# Altium footprint library mw.PcbLib: 113 footprints (part 5 of 8)
Each footprint in its own frame and in the unit in brackets; x right, y up, seen from the top. Pads: shape width x height; smd on the part's side, far side on the other; paste and mask are expansions set on the pad; w line width, h text height; cw(c..) or ccw(c..) is an arc to the next point about the centre after c.
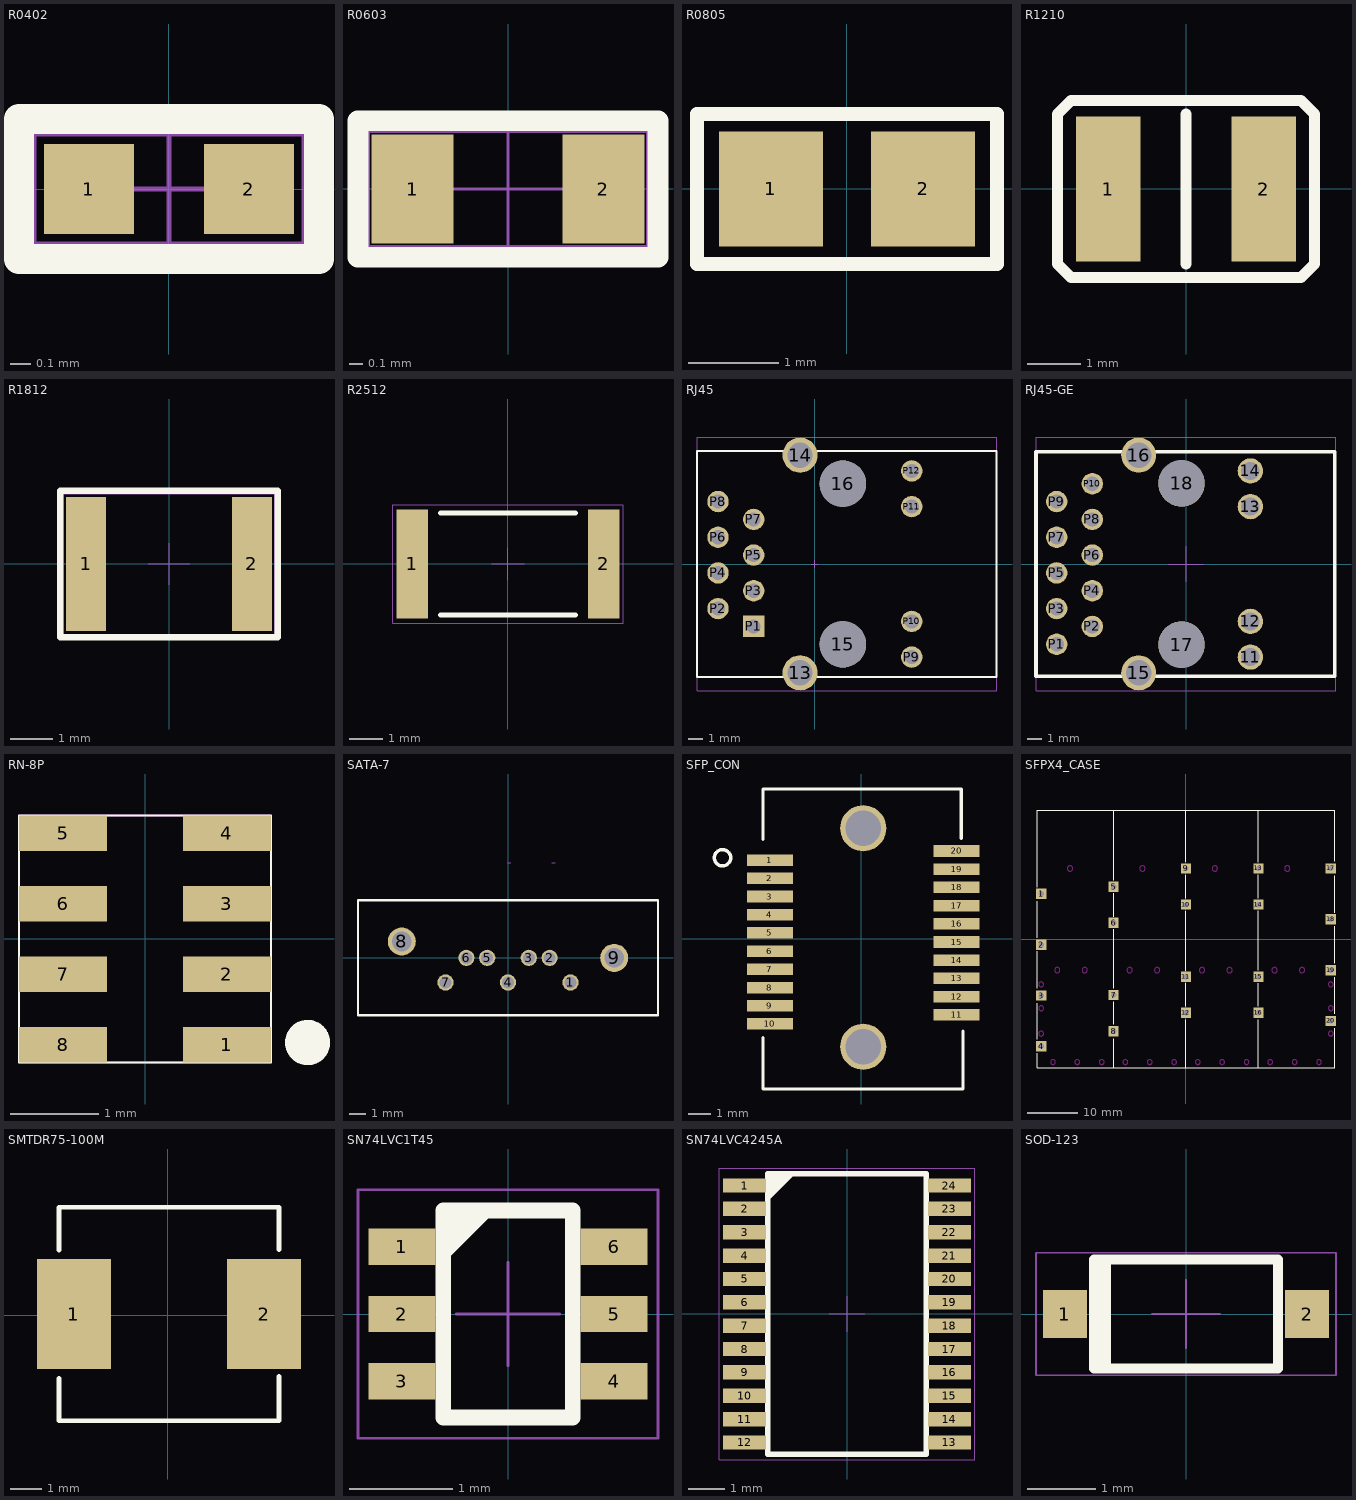
[diagram p4: the footprints below, top view; thin cyan lines are the x and y axes]

## R0402 [mm] "R0402"
pads (2):
  rect 0.45x0.45 smd: 1(-0.4,0) 2(0.4,0)
Top Overlay:
  lines w0.152: -0.75,-0.35 0.75,-0.35 0.75,0.35 -0.75,0.35 -0.75,-0.35
Mechanical 15:
  lines w0.025: -0.275,0 0.275,0 ; 0,-0.275 0,0.275 ; -0.674,-0.274 0.674,-0.274 0.674,0.274 -0.674,0.274 -0.674,-0.274
3D body "0402.STEP": height 0.3, standoff 0, extent -0.505,-0.247 0.495,0.254

## R0603 [mm] "R0603"
pads (2):
  rect 0.6x0.8 smd: 1(-0.7,-0.001) 2(0.7,-0.001)
Top Overlay:
  lines w0.152: -1.1,-0.501 -1.1,0.499 1.1,0.499 1.1,-0.501 -1.1,-0.501
Mechanical 15:
  lines w0.025: -0.45,-0.001 0.45,-0.001 ; 0,-0.451 0,0.449 ; -1.024,-0.425 1.024,-0.425 1.024,0.423 -1.024,0.423 -1.024,-0.425
3D body "0603.STEP": height 0.4, standoff 0, extent -0.801,-0.4 0.799,0.4

## R0805 [mil]
pads (2):
  rect 45x50 smd: 1(-33,0) 2(33,0)
Top Overlay:
  lines w6: -65,-32.5 65,-32.5 65,32.5 -65,32.5 -65,-32.5

## R1210 [mm] "R1210"
pads (2):
  rect 1.2x2.7 smd: 1(-1.45,-0.007) 2(1.45,-0.007)
Top Overlay:
  lines w0.203: 0,-1.404 0,1.39 ; -2.4,-1.404 -2.146,-1.658 2.146,-1.658 2.4,-1.404 2.4,1.39 2.146,1.644 -2.146,1.644 -2.4,1.39 -2.4,-1.404

## R1812 [mm]
height 0.6
pads (2):
  rect 0.95x3.2 smd: 1(-1.975,0) 2(1.975,0)
Top Overlay:
  lines w0.152: -2.591,-1.75 2.591,-1.75 2.591,1.75 -2.591,1.75 -2.591,-1.75
Mechanical 15:
  lines w0.025: -0.5,0 0.5,0 ; 0,-0.5 0,0.5 ; -2.515,-1.676 2.515,-1.676 2.515,1.676 -2.515,1.676 -2.515,-1.676
3D body "1812.STEP": height 0.6, standoff 0, extent -2.25,-1.6 2.25,1.6

## R2512 [mm] "Chip Resistor, 2-Leads, Body 6.35x3.20mm, IPC High Density"
height 0.55
pads (2):
  rect 0.95x3.3 smd: 1(-2.9,0) 2(2.9,0)
Top Overlay:
  lines w0.152: -2.05,-1.55 2.05,-1.55 ; -2.05,1.55 2.05,1.55
Mechanical 15:
  lines w0.025: -0.5,0 0.5,0 ; 0,-0.5 0,0.5 ; -3.5,-1.8 -3.5,1.8 3.5,1.8 3.5,-1.8 -3.5,-1.8
3D body: height 0.55, standoff 0, extent -2.725,-1.7 2.725,1.7
3D body: height 0.55, standoff 0, extent -3.225,-1.7 -2.725,1.7
3D body: height 0.55, standoff 0, extent 2.725,-1.7 3.225,1.7

## RJ45 [mm]
pads (16):
  round 2.5 hole 1.8: 13(-1.055,-7.745) 14(-1.055,7.745)
  round 3.3 hole 3.3 unplated: 15(1.995,-5.715) 16(1.995,5.715)
  rect 1.524x1.524 hole 1: P1(-4.355,-4.445)
  round 1.524 hole 1: P2(-6.895,-3.175) P3(-4.355,-1.905) P4(-6.895,-0.635) P5(-4.355,0.635) P6(-6.895,1.905) P7(-4.355,3.175) P8(-6.895,4.445) P9(6.895,-6.625) P10(6.895,-4.085) P11(6.895,4.085) P12(6.895,6.625)
Top Overlay:
  lines w0.152: -8.385,-8.05 -8.385,8.05 12.915,8.05 12.915,-8.05 -8.385,-8.05
Mechanical 15:
  lines w0.025: -0.254,0 0.254,0 ; 0,-0.254 0,0.254 ; -8.391,-9.035 -8.391,9.035 12.963,9.035 12.963,-9.035 -8.391,-9.035

## RJ45-GE [mil]
pads (18):
  round 70.87 hole 51.18: 11(180.41,-260.82) 12(180.41,-160.82) 13(180.41,160.83) 14(180.41,260.83)
  round 98 hole 70.87: 15(-132.58,-305.11) 16(-132.58,305.12)
  round 129.92 hole 129.92: 17(-12.5,-225.98) 18(-12.5,225.99)
  round 60 hole 40: P1(-362.5,-225) P2(-262.5,-175) P3(-362.5,-125) P4(-262.5,-75) P5(-362.5,-25) P6(-262.5,25) P7(-362.5,75) P8(-262.5,125) P9(-362.5,175) P10(-262.5,225)
Top Overlay:
  lines w10: -420.4,-314 -420.4,314 417.1,314 417.1,-314 -420.4,-314
Mechanical 15:
  lines w1: -50,0 50,0 ; 0,-50 0,50 ; -420.37,-355.69 420.37,-355.69 420.37,355.69 -420.37,355.69 -420.37,-355.69
3D body "hr911130a.STEP": height 506.61, standoff -123.31, extent -420.26,-317.1 418.32,318.33

## RN-8P [mm] "RN-8P"
pads (8):
  rect 1x0.4 smd: 1(0.929,-1.2) 2(0.929,-0.4) 3(0.929,0.4) 4(0.929,1.2) 5(-0.929,1.2) 6(-0.929,0.4) 7(-0.929,-0.4) 8(-0.929,-1.2)
Top Overlay:
  circle w0.254: c1.844,-1.175 r0.13
  lines w0.025: -1.429,-1.4 1.429,-1.4 1.429,1.4 -1.429,1.4 -1.429,-1.4
Mechanical 14:
  lines w0.025: -1.429,-1.4 1.429,-1.4 1.429,1.4 -1.429,1.4 -1.429,-1.4

## SATA-7 [mm] "SATA-7"
pads (9):
  round 0.994 hole 0.74: 1(3.81,-1.5) 2(2.54,0) 3(1.27,0) 4(0,-1.5) 5(-1.27,0) 6(-2.54,0) 7(-3.81,-1.5)
  round 1.708 hole 1.2: 8(-6.48,1) 9(6.48,0)
Top Overlay:
  lines w0.152: -9.15,-3.5 -9.15,3.5 9.15,3.5 9.15,-3.5 -9.15,-3.5
Mechanical 11:
  lines w0.025: -0.025,5.802 0.178,5.802 ; 2.667,5.802 2.87,5.802

## SFP_CON [mil] "SFP_CON"
pads (22):
  rect 80x20 smd: 1(-158,136) 2(-158,104.5) 3(-158,73.01) 4(-158,41.51) 5(-158,10.02) 6(-158,-21.48) 7(-158,-52.98) 8(-158,-84.47) 9(-158,-115.97) 10(-158,-147.46) 11(164.83,-131.72) 12(164.83,-100.22) 13(164.83,-68.72) 14(164.83,-37.23) 15(164.83,-5.73) 16(164.83,25.76) 17(164.83,57.26) 18(164.83,88.76) 19(164.83,120.25) 20(164.83,151.75)
  round 80 hole 62: " "(3.42,-186.83) " "(3.42,191.12)
Top Overlay:
  circle w6: c-240,140 r14.14
  lines w6: -170,-171 -170,-260 176,-260 176,-160 ; -170,172 -170,259 173,259 173,174

## SFPX4_CASE [mil] "SFPX4_CASE"
pads (20):
  rect 80x80 hole 42: 1(-1122.04,349.41) 2(-1122.04,-44.29) 3(-1122.04,-437.99) 4(-1122.04,-831.69) 5(-561.02,404.53) 6(-561.02,125) 7(-561.02,-434.05) 8(-561.02,-713.58) 9(0,546.26) 10(0,266.74) 11(0,-292.32) 12(0,-571.85) 13(561.02,546.26) 14(561.02,266.74) 15(561.02,-292.32) 16(561.02,-571.85) 17(1122.04,546.26) 18(1122.04,152.56) 19(1122.04,-241.14) 20(1122.04,-634.84)
Top Overlay:
  lines w6: -1153.54,-885.98 -1153.54,-999.01 1153.54,-999.01 1153.54,-690.98 ; -1153.54,-775.98 -1153.54,-495.98 ; -1153.54,-380.98 -1153.54,-95.98 ; -1153.54,9.02 -1153.54,294.02 ; -1153.54,399.02 -1153.54,999.02 1153.54,999.02 1153.54,604.02 ; -561.02,-995.98 -561.02,-770.98 ; -561.02,-660.98 -561.02,-485.98 ; -561.02,-380.98 -561.02,74.02 ; -561.02,174.02 -561.02,354.02 ; -561.02,454.02 -561.02,998 -560,999.02 ; 0,-995.98 0,-625.98 ; 0,-520.98 0,-340.98 ; 0,-245.98 0,214.02 ; 0,314.02 0,494.02 ; 0,599.02 0,998 1.02,999.02 ; 561.02,-995.98 561.02,-625.98 ; 561.02,-520.98 561.02,-340.98 ; 561.02,-240.98 561.02,219.02 ; 561.02,314.02 561.02,499.02 ; 561.02,594.02 561.02,998 562.04,999.02 ; 1153.54,-580.98 1153.54,-295.98 ; 1153.54,-185.98 1153.54,99.02 ; 1153.54,204.02 1153.54,489.02
Keep-Out Layer:
  circle w1: c-337.79,546.26 r21
  circle w1: c-223.62,-241.14 r21
  circle w1: c-436.22,-241.14 r21
  circle w1: c223.23,546.26 r21
  circle w1: c337.4,-241.14 r21
  circle w1: c124.8,-241.14 r21
  circle w1: c-280.71,-953.74 r19
  circle w1: c-469.68,-953.74 r19
  circle w1: c-91.73,-953.74 r19
  circle w1: c280.31,-953.74 r19
  circle w1: c91.34,-953.74 r19
  circle w1: c469.29,-953.74 r19
  circle w1: c-997.24,-241.14 r21
  circle w1: c-784.64,-241.14 r21
  circle w1: c-1122.04,-351.38 r19
  circle w1: c-1122.04,-536.42 r19
  circle w1: c-1122.04,-733.27 r19
  circle w1: c-841.73,-953.74 r19
  circle w1: c-1030.7,-953.74 r19
  circle w1: c-652.75,-953.74 r19
  circle w1: c-898.81,546.26 r21
  circle w1: c784.25,546.26 r21
  circle w1: c685.82,-241.14 r21
  circle w1: c898.42,-241.14 r21
  circle w1: c1122.04,-351.38 r19
  circle w1: c1122.04,-536.42 r19
  circle w1: c1122.04,-733.27 r19
  circle w1: c652.36,-953.74 r19
  circle w1: c841.33,-953.74 r19
  circle w1: c1030.31,-953.74 r19
Mechanical 10:
  text "1" at -1122.04,359.41 h25
  text "2" at -1122.04,-34.29 h25
  text "3" at -1122.04,-427.99 h25
  text "4" at -1122.04,-821.69 h25
  text "5" at -561.02,414.53 h25
  text "6" at -561.02,135 h25
  text "7" at -561.02,-424.05 h25
  text "8" at -561.02,-703.58 h25
  text "9" at 0,556.26 h25
  text "10" at 0,286.74 h25
  text "11" at 0,-272.32 h25
  text "12" at 0,-551.85 h25
  text "13" at 561.02,566.26 h25
  text "14" at 561.02,286.74 h25
  text "15" at 561.02,-272.32 h25
  text "16" at 561.02,-551.85 h25
  text "17" at 1122.04,566.26 h25
  text "18" at 1122.04,172.56 h25
  text "19" at 1122.04,-221.14 h25
  text "20" at 1122.04,-614.84 h25

## SMTDR75-100M [mil] "SMTDR75-100M"
pads (2):
  rect 92.5x137.8 smd: 1(-117.59,1.5) 2(120.59,1.5)
Top Overlay:
  lines w6: -136.3,-79.5 -136.3,-132.36 139.3,-132.36 139.3,-76.5 ; -136.3,81.5 -136.3,135.36 139.3,135.36 139.3,82.5

## SN74LVC1T45 [mm]
height 1
pads (6):
  rect 0.65x0.35 smd: 1(-1.025,0.65) 2(-1.025,0) 3(-1.025,-0.65) 4(1.025,-0.65) 5(1.025,0) 6(1.025,0.65)
Top Overlay:
  region: -0.127,0.991 -0.625,0.492 -0.625,1
  lines w0.152: -0.625,-1 0.625,-1 0.625,1 -0.625,1 -0.625,-1
Mechanical 15:
  lines w0.025: -0.5,0 0.5,0 ; 0,-0.5 0,0.5 ; -1.45,-1.2 1.45,-1.2 1.45,1.2 -1.45,1.2 -1.45,-1.2
3D body "sn74lvc1t45dckr.STEP": height 0.98, standoff 0, extent -1.035,-1 1.035,1

## SN74LVC4245A [mm] "TSOP, 24-Leads, Body 7.80x4.47mm, Pitch 0.65mm, IPC High Density"
height 1.2
pads (24):
  rect 1.2x0.4 smd: 1(-2.85,3.575) 2(-2.85,2.925) 3(-2.85,2.275) 4(-2.85,1.625) 5(-2.85,0.975) 6(-2.85,0.325) 7(-2.85,-0.325) 8(-2.85,-0.975) 9(-2.85,-1.625) 10(-2.85,-2.275) 11(-2.85,-2.925) 12(-2.85,-3.575) 13(2.85,-3.575) 14(2.85,-2.925) 15(2.85,-2.275) 16(2.85,-1.625) 17(2.85,-0.975) 18(2.85,-0.325) 19(2.85,0.325) 20(2.85,0.975) 21(2.85,1.625) 22(2.85,2.275) 23(2.85,2.925) 24(2.85,3.575)
Top Overlay:
  region: -1.434,3.9 -2.2,3.134 -2.2,3.9
  lines w0.152: -2.2,-3.9 -2.2,3.9 2.2,3.9 2.2,-3.9 -2.2,-3.9
Mechanical 15:
  lines w0.025: -0.5,0 0.5,0 ; 0,-0.5 0,0.5 ; -3.55,-4.05 -3.55,4.05 3.55,4.05 3.55,-4.05 -3.55,-4.05

## SOD-123 [mm]
pads (2):
  rect 0.65x0.7 smd: 1(-1.775,0) 2(1.775,0)
Top Overlay:
  rectangle: -1.35,-0.8 -1.1,0.8
  lines w0.152: -1.35,-0.8 -1.35,0.8 1.35,0.8 1.35,-0.8 -1.35,-0.8
Mechanical 15:
  lines w0.025: -0.5,0 0.5,0 ; 0,-0.5 0,0.5 ; -2.2,-0.9 2.2,-0.9 2.2,0.9 -2.2,0.9 -2.2,-0.9
3D body "sod123.STEP": height 1.17, standoff 0, extent -1.85,-0.8 1.85,0.8